# Altium footprint library SG_PCB_HOLE_Connector.PcbLib: 133 footprints (part 3 of 9)
Each footprint in its own frame and in the unit in brackets; x right, y up, seen from the top. Pads: shape width x height; smd on the part's side, far side on the other; paste and mask are expansions set on the pad; w line width, h text height; cw(c..) or ccw(c..) is an arc to the next point about the centre after c.
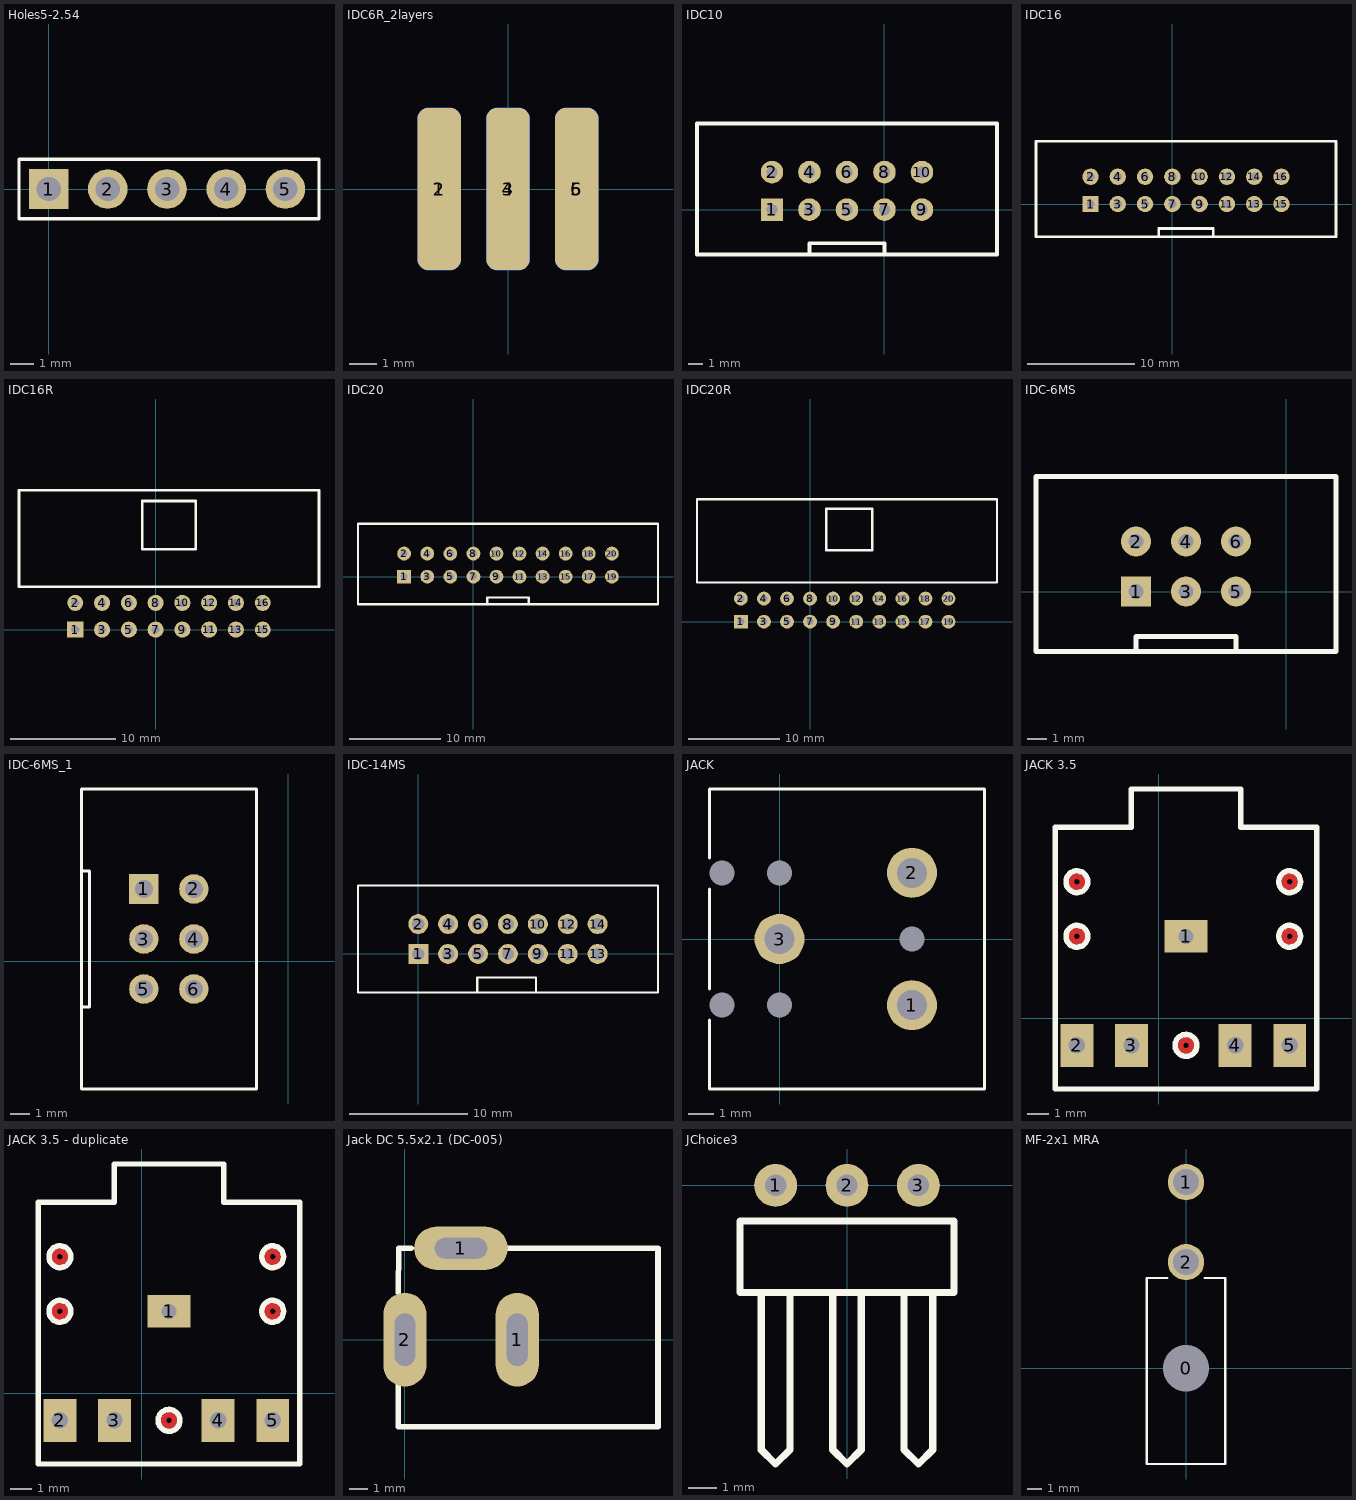
[diagram p2: the footprints below, top view; thin cyan lines are the x and y axes]

## Holes5-2.54 [mm]
pads (5):
  rect 1.7x1.7 hole 1.05 mask+0.05: 1(0,0)
  round 1.7 hole 1.05 mask+0.05: 2(2.54,0) 3(5.08,0) 4(7.62,0) 5(10.16,0)
Top Overlay:
  lines w0.15: -1.27,-1.27 -1.27,1.27 11.6,1.27 11.6,-1.27 -1.27,-1.27

## IDC6R_2layers [mm]
pads (6):
  rrect50% 1.6x6 smd far side: 1(-2.54,0) 3(0,0) 5(2.54,0)
  rrect50% 1.6x6 smd: 2(-2.54,0) 4(0,0) 6(2.54,0)
3D body "IDC-6MS.step": height 4.37, standoff -4.48, extent -7.61,-11.71 7.61,0.69

## IDC10 [mil]
pads (10):
  rect 60x60 hole 30: 1(-300,0)
  round 60 hole 30: 2(-300,100) 3(-200,0) 4(-200,100) 5(-100,0) 6(-100,100) 7(0,0) 8(0,100) 9(100,0) 10(100,100)
Top Overlay:
  lines w10: -200,-120 -200,-90 0,-90 0,-120 ; -500,-120 -500,230 300,230 300,-120 -500,-120
3D body "IDC-10M.STEP": height 366.14, standoff -122.05, extent -499.61,-123.23 299.61,235.04

## IDC16 [mil]
pads (16):
  rect 60x60 hole 30: 1(-300,0)
  round 60 hole 30: 2(-300,100) 3(-200,0) 4(-200,100) 5(-100,0) 6(-100,100) 7(0,0) 8(0,100) 9(100,0) 10(100,100) 11(200,0) 12(200,100) 13(300,0) 14(300,100) 15(400,0) 16(400,100)
Top Overlay:
  lines w10: -50,-120 -50,-90 0,-90 150,-90 150,-120 ; -500,-120 -500,230 600,230 600,-120 -500,-120
3D body "IDC16.step": height 359.45, standoff -128.74, extent -499.61,-118.43 599.6,230

## IDC16R [mil]
pads (16):
  rect 60x60 hole 30: 1(-300,0)
  round 60 hole 30: 2(-300,100) 3(-200,0) 4(-200,100) 5(-100,0) 6(-100,100) 7(0,0) 8(0,100) 9(100,0) 10(100,100) 11(200,0) 12(200,100) 13(300,0) 14(300,100) 15(400,0) 16(400,100)
Top Overlay:
  lines w10: -510,160 -510,520 610,520 610,160 -510,160 ; -50,300 -50,480 150,480 150,300 -50,300
3D body "IDC16R.step": height 353.54, standoff -93.31, extent -510,-16.93 614.41,516.93

## IDC20 [mil]
pads (20):
  rect 60x60 hole 30: 1(-300,0)
  round 60 hole 30: 2(-300,100) 3(-200,0) 4(-200,100) 5(-100,0) 6(-100,100) 7(0,0) 8(0,100) 9(100,0) 10(100,100) 11(200,0) 12(200,100) 13(300,0) 14(300,100) 15(400,0) 16(400,100) 17(500,0) 18(500,100) 19(600,0) 20(600,100)
Top Overlay:
  lines w10: 60,-120 60,-90 240,-90 240,-120 ; -500,-120 800,-120 800,230 -500,230 -500,-120
3D body "IDC20.step": height 379.13, standoff -109.06, extent -499.61,-127.32 799.61,221.1

## IDC20R [mil]
pads (20):
  rect 60x60 hole 30: 1(-300,0)
  round 60 hole 30: 2(-300,100) 3(-200,0) 4(-200,100) 5(-100,0) 6(-100,100) 7(0,0) 8(0,100) 9(100,0) 10(100,100) 11(200,0) 12(200,100) 13(300,0) 14(300,100) 15(400,0) 16(400,100) 17(500,0) 18(500,100) 19(600,0) 20(600,100)
Top Overlay:
  lines w10: -490,170 -490,530 810,530 810,170 -490,170 ; 70,310 70,490 270,490 270,310 70,310
3D body "IDC20r.step": height 353.54, standoff -93.31, extent -504.41,-6.93 820,526.93

## IDC-6MS [mil]
pads (6):
  rect 60x60 hole 30: 1(-300,0)
  round 60 hole 30: 2(-300,100) 3(-200,0) 4(-200,100) 5(-100,0) 6(-100,100)
Top Overlay:
  lines w10: -300,-120 -300,-90 -100,-90 -100,-120 ; -500,-120 -500,230 100,230 100,-120 -500,-120
3D body "IDC-6MS.step": height 379.13, standoff -109.06, extent -500,-120 99.21,228.42

## IDC-6MS_1 [mm]
pads (6):
  rect 1.5x1.5 hole 0.9: 1(-7.33,3.66)
  round 1.5 hole 0.9: 2(-4.79,3.66) 3(-7.33,1.12) 4(-4.79,1.12) 5(-7.33,-1.42) 6(-4.79,-1.42)
Top Overlay:
  lines w0.15: -10.46,-2.34 -10.1,-2.34 -10.1,4.57 ; -10.5,-6.5 -1.61,-6.5 -1.61,8.74 -10.5,8.74 -10.5,-6.5
  lines w0.152: -10.5,4.57 -10.1,4.57

## IDC-14MS [mm]
height 12
pads (14):
  rect 1.7x1.7 hole 1.05 mask+0.05: 1(0,0)
  round 1.7 hole 1.05 mask+0.05: 2(0,2.54) 3(2.54,0) 4(2.54,2.54) 5(5.08,0) 6(5.08,2.54) 7(7.62,0) 8(7.62,2.54) 9(10.16,0) 10(10.16,2.54) 11(12.7,0) 12(12.7,2.54) 13(15.24,0) 14(15.24,2.54)
Top Overlay:
  lines w0.15: -5.12,-3.28 -5.12,5.82 20.37,5.82 20.37,-3.28 -5.12,-3.28
  lines w0.2: 5,-3.28 5,-2 10,-2 10,-3.28
3D body "IDC-14MS.STEP": height 9.25, standoff -3.45, extent -5.08,-3.405 20.32,5.945

## JACK [mm]
pads (8):
  round 0 hole 1: 0(-2.3,-2.65) 0(-2.3,2.65) 0(0,-2.65) 0(0,2.65) 0(5.3,0)
  round 2 hole 1.2: 1(5.3,-2.65) 2(5.3,2.65) 3(0,0)
Top Overlay:
  lines w0.127: -2.8,-3.25 -2.8,-6 8.2,-6 8.2,6 -2.8,6 -2.8,3.25 ; -2.8,-2 -2.8,2

## JACK 3.5 [mil]
pads (5):
  rect 78.74x60 hole 27.56 square: 1(50,150)
  rect 60x78.74 hole 30: 2(-150,-50) 3(-50,-50) 4(140,-50) 5(240,-50)
Top Layer:
  circle w10: c-150,250 r10
  circle w10: c-150,150 r10
  circle w10: c240,250 r10
  circle w10: c240,150 r10
  circle w10: c50,-50 r10
Top Overlay:
  circle w10: c50,-50 r20
  circle w10: c-150,150 r20
  circle w10: c-150,250 r20
  circle w10: c240,150 r20
  circle w10: c240,250 r20
  lines w10: -190,-130 -190,350 -50,350 -50,420 150,420 150,350 290,350 290,-130 -190,-130
3D body "jack 3-5.stp": height 216.54, standoff -118.11, extent -192.44,-135.59 280,415.59

## JACK 3.5 - duplicate [mil]
pads (5):
  rect 78.74x60 hole 27.56 square: 1(50,150)
  rect 60x78.74 hole 30: 2(-150,-50) 3(-50,-50) 4(140,-50) 5(240,-50)
Top Layer:
  circle w10: c50,-50 r10
  circle w10: c240,150 r10
  circle w10: c240,250 r10
  circle w10: c-150,150 r10
  circle w10: c-150,250 r10
Top Overlay:
  circle w10: c240,250 r20
  circle w10: c240,150 r20
  circle w10: c-150,250 r20
  circle w10: c-150,150 r20
  circle w10: c50,-50 r20
  lines w10: -190,-130 290,-130 290,350 150,350 150,420 -50,420 -50,350 -190,350 -190,-130
3D body "jack 3-5.stp": height 216.54, standoff -118.11, extent -192.44,-135.59 280,415.59

## Jack DC 5.5x2.1 (DC-005) [mm]
pads (3):
  oval 5x2.3 hole 1.1 slot 2.8 at 0 deg: 1(2.993,4.88)
  oval 2.3x5 hole 1.1 slot 2.8 at 90 deg: 1(5.993,0) 2(0,0)
Top Overlay:
  lines w0.3: -0.359,-2.15 -0.359,-4.636 13.5,-4.636 13.5,4.88 4.491,4.88 ; -0.353,2.5 -0.326,4.88 0.324,4.88
3D body "User Library-dc range - dc connector[4840_2201].STEP": height 12, standoff -2.5, extent -0.326,-4.626 13.5,4.88

## JChoice3 [mil]
pads (3):
  round 60 hole 30: 1(-100,0) 2(0,0) 3(100,0)
Top Overlay:
  lines w10: -120,-150 -120,-370 -100,-390 -80,-370 -80,-150 ; -20,-150 -20,-370 0,-390 20,-370 20,-150 ; 80,-150 80,-370 100,-390 120,-370 120,-150 ; -150,-150 150,-150 150,-50 -150,-50 -150,-150
3D body "pls2r.stp": height 168.11, standoff -51.18, extent -50,-388.03 150,19.06
3D body "pls2r.stp": height 168.11, standoff -51.18, extent -150,-388.03 50,19.06

## MF-2x1 MRA [mm]
height 12
pads (3):
  round 2.5 hole 3.2 unplated mask+0.05: 0(0,0)
  round 2.5 hole 1.8 mask+0.05: 1(0,12.8) 2(0,7.3)
Top Overlay:
  lines w0.15: -1.275,6.2 -2.7,6.2 -2.7,-6.6 2.7,-6.6 2.7,6.2 1.275,6.2
3D body "Mini-Fit 2 pin.STEP": height 11.4, standoff -3.6, extent -2.9,-6.643 2.9,13.292